# Altium footprint library Gate Driver Board.PcbLib: 117 footprints (part 7 of 8)
Each footprint in its own frame and in the unit in brackets; x right, y up, seen from the top. Pads: shape width x height; smd on the part's side, far side on the other; paste and mask are expansions set on the pad; w line width, h text height; cw(c..) or ccw(c..) is an arc to the next point about the centre after c.
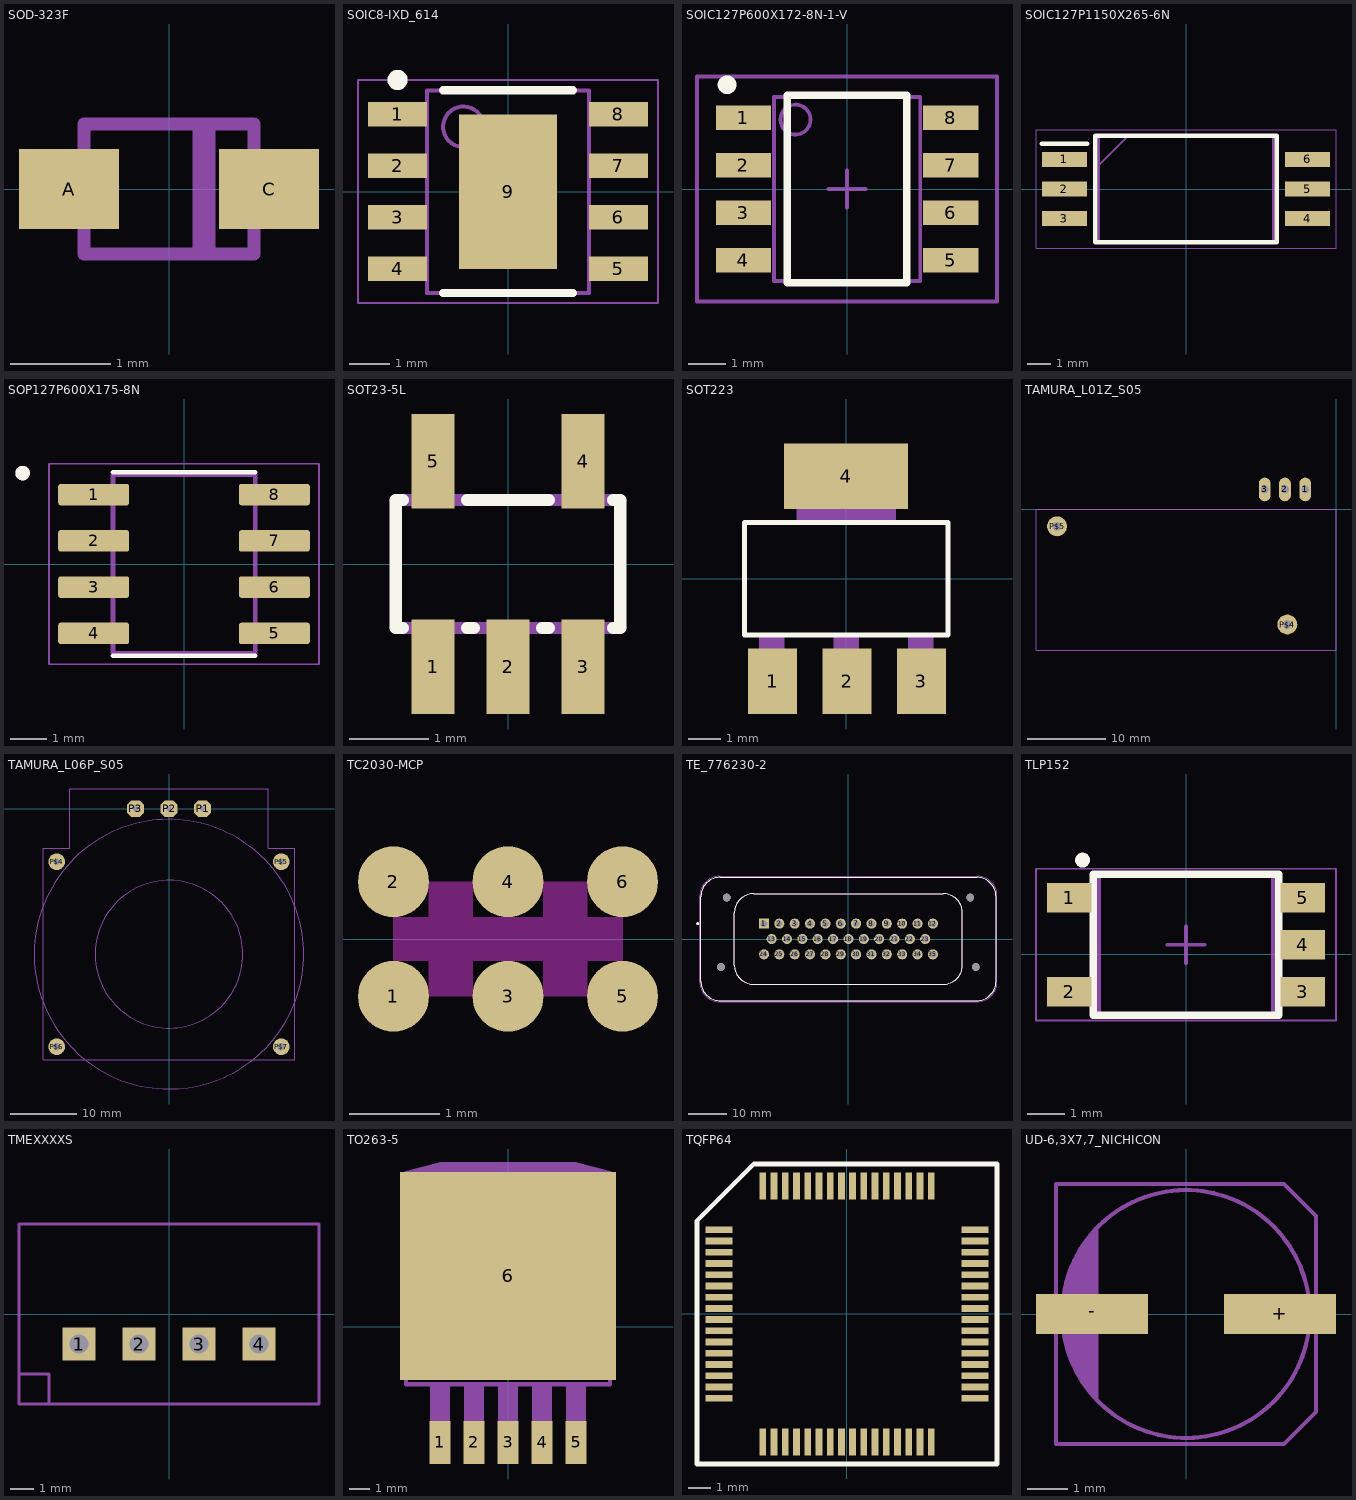
[diagram p6: the footprints below, top view; thin cyan lines are the x and y axes]

## SOD-323F [mm] "SOD-323F"
pads (2):
  rect 1x0.8 smd: A(-1,0) C(1,0)
Assembly Bottom:
  lines w0.127: -0.9,-0.2 -1.2,-0.2 -1.2,0.2 -0.9,0.2 ; 0.9,-0.2 1.2,-0.2 1.2,0.2 0.9,0.2
3D Body Bottom:
  lines w0.127: 0.3,0.6 0.3,-0.6 0.4,-0.6 0.4,0.6 ; -0.85,-0.65 -0.85,0.65 0.85,0.65 0.85,-0.65 -0.85,-0.65

## SOIC8-IXD_614 [mm]
height 1.7
pads (9):
  rect 1.45x0.6 smd: 1(-2.725,1.905) 2(-2.725,0.635) 3(-2.725,-0.635) 4(-2.725,-1.905) 5(2.725,-1.905) 6(2.725,-0.635) 7(2.725,0.635) 8(2.725,1.905)
  rect 2.41x3.81 smd: 9(0,0)
Top Overlay:
  circle w0.25: c-2.725,2.755 r0.125
  lines w0.2: -1.6,-2.5 1.6,-2.5 ; -1.6,2.5 1.6,2.5
Assembly Top:
  circle w0.1: c-1.1,1.6 r0.5
  lines w0.1: -2,-2.5 -2,2.5 2,2.5 2,-2.5 -2,-2.5
Courtyard Top:
  lines w0.05: -3.7,-2.75 -3.7,2.75 3.7,2.75 3.7,-2.75 -3.7,-2.75
  lines w0.1: -0.5,0 0.5,0 ; 0,-0.5 0,0.5
3D body "SOIC8-IXD_614.step": height 1.7, standoff 0, extent -3,-2.5 3,2.5

## SOIC127P600X172-8N-1-V [mm] "SOIC,1.27mm pitch;8 pin,3.90mm W X 4.90mm L X 1.72mm H body"
height 1.72
pads (8):
  rect 1.47x0.65 smd paste+0 mask+0: 1(-2.765,1.905) 2(-2.765,0.635) 3(-2.765,-0.635) 4(-2.765,-1.905) 5(2.765,-1.905) 6(2.765,-0.635) 7(2.765,0.635) 8(2.765,1.905)
Top Overlay:
  circle w0.25: c-3.2,2.78 r0.125
  lines w0.2: -1.6,-2.5 1.6,-2.5 1.6,2.5 -1.6,2.5 -1.6,-2.5
Assembly Bottom:
  text ".DESIGNATOR" at 0,0 h0.5
Mechanical 13:
  circle w0.1: c-1.372,1.852 r0.4
  lines w0.1: -1.95,-2.45 1.95,-2.45 1.95,2.45 -1.95,2.45 -1.95,-2.45
Mechanical 15:
  lines w0.1: -0.5,0 0.5,0 ; 0,-0.5 0,0.5 ; -4,-3 4,-3 4,3 -4,3 -4,-3
3D body "PG-DSO-8-69_Z8B00186941_V02_3D.STEP": height 1.73, standoff 0, extent -3,-2.45 3,2.45

## SOIC127P1150X265-6N [mm]
pads (6):
  rect 1.95x0.65 smd: 1(-5.225,1.27) 2(-5.225,0) 3(-5.225,-1.27) 4(5.225,-1.27) 5(5.225,0) 6(5.225,1.27)
Top Overlay:
  lines w0.2: -6.2,1.945 -4.25,1.945 ; -3.9,-2.29 3.9,-2.29 3.9,2.29 -3.9,2.29 -3.9,-2.29
Mechanical 13:
  lines w0.1: -3.75,1.02 -2.48,2.29 ; -3.75,-2.29 3.75,-2.29 3.75,2.29 -3.75,2.29 -3.75,-2.29
Mechanical 15:
  lines w0.05: -6.45,-2.54 6.45,-2.54 6.45,2.54 -6.45,2.54 -6.45,-2.54
3D body "Si8261ACD-C-IS.stp": height 2.65, standoff 0, extent -5.75,-2.29 5.75,2.29

## SOP127P600X175-8N [mm]
pads (8):
  rrect25% 1.95x0.59 smd: 1(-2.48,1.905) 2(-2.48,0.635) 3(-2.48,-0.635) 4(-2.48,-1.905) 5(2.48,-1.905) 6(2.48,-0.635) 7(2.48,0.635) 8(2.48,1.905)
Top Overlay:
  circle w0.2: c-4.43,2.495 r0.1
  lines w0.127: -1.95,-2.52 1.95,-2.52 ; -1.95,2.52 1.95,2.52
Mechanical 13:
  circle w0.2: c-4.43,2.495 r0.1
  lines w0.127: -1.95,-2.45 -1.95,2.45 1.95,2.45 1.95,-2.45 -1.95,-2.45
Mechanical 15:
  lines w0.05: -3.705,-2.75 -3.705,2.75 3.705,2.75 3.705,-2.75 -3.705,-2.75
3D body "step_temp.STEP": height 2.1, standoff 0, extent -3,-2.425 3,2.425

## SOT23-5L [mm] "SOT23-5L"
pads (5):
  rect 0.55x1.2 smd: 1(-0.95,-1.3) 2(0,-1.3) 3(0.95,-1.3) 4(0.95,1.3) 5(-0.95,1.3)
Top Overlay:
  lines w0.152: -1.328,-0.81 -1.422,-0.81 -1.422,0.81 -1.328,0.81 ; -0.522,-0.81 -0.428,-0.81 ; -0.522,0.81 0.522,0.81 ; 0.428,-0.81 0.522,-0.81 ; 1.328,-0.81 1.422,-0.81 1.422,0.81 1.328,0.81
Assembly Bottom:
  region: -1.2,-1.5 -1.2,-0.85 -0.7,-0.85 -0.7,-1.5
  region: -0.25,-1.5 -0.25,-0.85 0.25,-0.85 0.25,-1.5
  region: 0.7,-1.5 0.7,-0.85 1.2,-0.85 1.2,-1.5
  region: 0.7,0.85 0.7,1.5 1.2,1.5 1.2,0.85
  region: -1.2,0.85 -1.2,1.5 -0.7,1.5 -0.7,0.85
  lines w0.152: -1.422,-0.81 1.422,-0.81 ; -1.422,0.81 1.422,0.81
3D body "SOT23_5.stp": height 0.92, standoff 0.01, extent -1.5,-1.675 1.5,1.53

## SOT223 [mil] "SOT223"
pads (4):
  rect 59x79 smd: 1(-89,-124) 2(1,-124) 3(91,-124)
  rect 150x79 smd: 4(0,124)
Top Overlay:
  lines w6: -122.99,-68.07 -122.99,68.15 122.99,68.15 122.99,-68.07 -122.99,-68.07
Assembly Bottom:
  region: -60,70 -60,130 60,130 60,70
  region: -105,-130 -105,-70 -75,-70 -75,-130
  region: 75,-130 75,-70 105,-70 105,-130
  region: -15,-130 -15,-70 15,-70 15,-130
3D body "SOT223.STEP": height 63.49, standoff -3.42, extent -123.03,-142.69 132.87,133.86

## TAMURA_L01Z_S05 [mm] "TAMURA_L01Z_S05"
pads (5):
  oval 1.508x3.016 / inner round 0 / far side oval 1.508x3.016 hole 1: 1(-3.92,2.5) 2(-6.5,2.5) 3(-9.08,2.5)
  round 2.54 / inner round 0 / far side round 2.54 hole 1.1: P$4(-6.2,-14.7) P$5(-35.52,-2.2)
3D Body Bottom:
  lines w0.127: -38.2,-18 -38.2,0 0,0 0,-18 -38.2,-18
  text "L01Z    S05" at -29.21,-10.16 h3.94
3D body: height 1.27, standoff 0, extent -4.68,0.986 -3.159,4.015
3D body: height 1.27, standoff 0, extent -7.261,0.986 -5.74,4.015
3D body: height 1.27, standoff 0, extent -9.84,0.986 -8.319,4.015
3D body: height 1.27, standoff 0, extent -7.481,-15.981 -4.919,-13.419
3D body: height 1.27, standoff 0, extent -36.801,-3.481 -34.239,-0.919

## TAMURA_L06P_S05 [mm] "TAMURA_L06P_S05"
pads (7):
  oct 2.54x2.54 / inner round 0 / far side oct 2.54x2.54 hole 0.8: P1(5.08,0) P2(0,0) P3(-5.08,0)
  round 2.54 / inner round 0 / far side round 2.54 hole 1: P$4(-17,-8) P$5(17,-8)
  round 2.54 / inner round 0 / far side round 2.54 hole 1.1: P$6(-17,-36) P$7(17,-36)
3D Body Bottom:
  circle w0.127: c0,-22 r20.396
  circle w0.127: c0,-22 r11.18
  lines w0.127: -19,-38 -19,-6 -15,-6 -15,3 15,3 15,-6 19,-6 19,-38 -19,-38
3D body: height 1.27, standoff 0, extent 15.719,-37.281 18.281,-34.719
3D body: height 1.27, standoff 0, extent -18.281,-37.281 -15.719,-34.719
3D body: height 1.27, standoff 0, extent 15.719,-9.281 18.281,-6.719
3D body: height 1.27, standoff 0, extent -18.281,-9.281 -15.719,-6.719
3D body: height 1.27, standoff 0, extent 3.897,-1.183 6.263,1.183
3D body: height 1.27, standoff 0, extent -6.263,-1.183 -3.897,1.183
3D body: height 1.27, standoff 0, extent -1.183,-1.183 1.183,1.183

## TC2030-MCP [mil] "TC2030-MCP"
pads (6):
  rrect100% 31x31 smd paste+0: 1(50,-25) 2(50,25) 3(100,-25) 4(100,25) 5(150,-25) 6(150,25)
Top Layer keep-out:
  region: 50,-9.5 65.5,-9.5 65.5,-25 84.5,-25 84.5,-9.5 115.5,-9.5 115.5,-25 134.5,-25 134.5,-9.5 150,-9.5 150,9.5 134.5,9.5 134.5,25 115.5,25 115.5,9.5 84.5,9.5 84.5,25 65.5,25 65.5,9.5 50,9.5

## TE_776230-2 [mm]
pads (39):
  rect 2.625x2.625 hole 1.75: 1(-22,4)
  round 2.625 hole 1.75: 2(-18,4) 3(-14,4) 4(-10,4) 5(-6,4) 6(-2,4) 7(2,4) 8(6,4) 9(10,4) 10(14,4) 11(18,4) 12(22,4) 13(-20,0) 14(-16,0) 15(-12,0) 16(-8,0) 17(-4,0) 18(0,0) 19(4,0) 20(8,0) 21(12,0) 22(16,0) 23(20,0) 24(-22,-4) 25(-18,-4) 26(-14,-4) 27(-10,-4) 28(-6,-4) 29(-2,-4) 30(2,-4) 31(6,-4) 32(10,-4) 33(14,-4) 34(18,-4) 35(22,-4)
  round 2 hole 2 unplated: ""(-33.2,-7.3) ""(-31.7,10.8) ""(31.7,10.8) ""(33.2,-7.3)
Top Overlay:
  circle w0.4: c-39.25,4 r0.2
  lines w0.127: -38.45,-11.05 ccw(c-33.45,-11.05) -33.45,-16.05 33.45,-16.05 ccw(c33.45,-11.05) 38.45,-11.05 38.45,11.05 ccw(c33.45,11.05) 33.45,16.05 -33.45,16.05 ccw(c-33.45,11.05) -38.45,11.05 -38.45,-11.05 ; -29.7,-6.8 ccw(c-24.7,-6.8) -24.7,-11.8 24.7,-11.8 ccw(c24.7,-6.8) 29.7,-6.8 29.7,6.8 ccw(c24.7,6.8) 24.7,11.8 -24.7,11.8 ccw(c-24.7,6.8) -29.7,6.8 -29.7,-6.8
Mechanical 13:
  circle w0.4: c-22,4 r0.2
  lines w0.127: -38.45,-11.05 ccw(c-33.45,-11.05) -33.45,-16.05 33.45,-16.05 ccw(c33.45,-11.05) 38.45,-11.05 38.45,11.05 ccw(c33.45,11.05) 33.45,16.05 -33.45,16.05 ccw(c-33.45,11.05) -38.45,11.05 -38.45,-11.05 ; -29.7,-6.8 ccw(c-24.7,-6.8) -24.7,-11.8 24.7,-11.8 ccw(c24.7,-6.8) 29.7,-6.8 29.7,6.8 ccw(c24.7,6.8) 24.7,11.8 -24.7,11.8 ccw(c-24.7,6.8) -29.7,6.8 -29.7,-6.8
Mechanical 15:
  lines w0.05: -38.7,-11.3 ccw(c-33.7,-11.3) -33.7,-16.3 33.7,-16.3 ccw(c33.7,-11.3) 38.7,-11.3 38.7,11.3 ccw(c33.7,11.3) 33.7,16.3 -33.7,16.3 ccw(c-33.7,11.3) -38.7,11.3 -38.7,-11.3
3D body "776230-2--3DModel-STEP-1.STEP": height 30.48, standoff -7.49, extent -38.434,-15.964 38.466,16.136

## TLP152 [mm] "SOTFL, 5-Leads, Body 3.75x7.20mm, Pitch 1.27mm, IPC Medium Density"
height 2.2
pads (5):
  rect 1.2x0.8 smd: 1(-3.15,1.524) 2(-3.15,-1.016) 3(3.15,-1.016) 4(3.15,0.254) 5(3.15,1.524)
Top Overlay:
  lines w0.2: -2.5,-1.646 -2.5,2.154 2.5,2.154 2.5,-1.646 -2.5,-1.646
  lines w0.25: -2.72,2.538 cw(c-2.794,2.54) -2.72,2.547
Assembly Top:
  lines w0.1: -2.35,-1.646 2.35,-1.646 2.35,2.154 -2.35,2.154 -2.35,-1.646
Courtyard Top:
  lines w0.05: -4.05,-1.796 4.05,-1.796 4.05,2.304 -4.05,2.304 -4.05,-1.796
  lines w0.1: -0.5,0.254 0.5,0.254 ; 0,-0.246 0,0.754
3D body "User Library-TLP-152-1.STEP": height 2.11, standoff 0.01, extent -3.393,-1.651 3.383,2.149

## TMEXXXXS [mil] "TMEXXXXS"
pads (4):
  rect 55x55 / inner round 0 / far side rect 55x55 hole 32: 1(-150,-50) 2(-50,-50) 3(50,-50) 4(150,-50)
3D Body Bottom:
  lines w5: -250,-100 -200,-100 -200,-150 ; -250,-100 -250,150 250,150 250,-150 -200,-150 ; -250,-100 -250,-150 -200,-150
  text "A+" at 100,0 h77.5
  text "A-" at 0,0 h77.5
  text "E+" at -100,0 h77.5
  text "E-" at -200,0 h77.5
3D body: height 50, standoff 0, extent 124.1,-75.9 175.9,-24.1
3D body: height 50, standoff 0, extent 24.1,-75.9 75.9,-24.1
3D body: height 50, standoff 0, extent -75.9,-75.9 -24.1,-24.1
3D body: height 50, standoff 0, extent -175.9,-75.9 -124.1,-24.1

## TO263-5 [mil] "TO263-5"
pads (6):
  rect 42x85 smd: 1(-134,-228) 2(-67,-228) 3(0,-228) 4(67,-228) 5(134,-228)
  rect 425.2x409.84 smd: 6(0,100)
Assembly Bottom:
  region: -201,286.1 -201,302.29 -133,320.29 133,320.29 201,302.29 201,286.1
  region: 115,-260 115,-175 153,-175 153,-260
  region: 48,-260 48,-175 86,-175 86,-260
  region: -19,-260 -19,-175 19,-175 19,-260
  region: -86,-260 -86,-175 -48,-175 -48,-260
  region: -153,-260 -153,-175 -115,-175 -115,-260
  lines w8: -200.55,-113.39 -200.55,282.09 200.55,282.09 200.55,-113.39 ; -200.98,286.1 200.98,286.1 200.98,302.28 132.99,320.28 -132.99,320.28 -200.98,302.28 -200.98,286.1
3D Body Bottom:
  region: 115,-176 115,-110 153,-110 153,-176
  region: 48,-176 48,-110 86,-110 86,-176
  region: -19,-176 -19,-110 19,-110 19,-176
  region: -86,-176 -86,-110 -48,-110 -48,-176
  region: -153,-176 -153,-110 -115,-110 -115,-176
  lines w8: -200.55,-113.39 200.55,-113.39

## TQFP64 [mm] "TQFP64"
pads (64):
  rect 1.2x0.3 smd: 1(-5.7,3.75) 2(-5.7,3.25) 3(-5.7,2.75) 4(-5.7,2.25) 5(-5.7,1.75) 6(-5.7,1.25) 7(-5.7,0.75) 8(-5.7,0.25) 9(-5.7,-0.25) 10(-5.7,-0.75) 11(-5.7,-1.25) 12(-5.7,-1.75) 13(-5.7,-2.25) 14(-5.7,-2.75) 15(-5.7,-3.25) 16(-5.7,-3.75) 33(5.7,-3.75) 34(5.7,-3.25) 35(5.7,-2.75) 36(5.7,-2.25) 37(5.7,-1.75) 38(5.7,-1.25) 39(5.7,-0.75) 40(5.7,-0.25) 41(5.7,0.25) 42(5.7,0.75) 43(5.7,1.25) 44(5.7,1.75) 45(5.7,2.25) 46(5.7,2.75) 47(5.7,3.25) 48(5.7,3.75)
  rect 0.3x1.2 smd: 17(-3.75,-5.7) 18(-3.25,-5.7) 19(-2.75,-5.7) 20(-2.25,-5.7) 21(-1.75,-5.7) 22(-1.25,-5.7) 23(-0.75,-5.7) 24(-0.25,-5.7) 25(0.25,-5.7) 26(0.75,-5.7) 27(1.25,-5.7) 28(1.75,-5.7) 29(2.25,-5.7) 30(2.75,-5.7) 31(3.25,-5.7) 32(3.75,-5.7) 49(3.75,5.7) 50(3.25,5.7) 51(2.75,5.7) 52(2.25,5.7) 53(1.75,5.7) 54(1.25,5.7) 55(0.75,5.7) 56(0.25,5.7) 57(-0.25,5.7) 58(-0.75,5.7) 59(-1.25,5.7) 60(-1.75,5.7) 61(-2.25,5.7) 62(-2.75,5.7) 63(-3.25,5.7) 64(-3.75,5.7)
Top Overlay:
  lines w0.203: -6.675,-6.675 6.675,-6.675 6.675,6.675 -4.15,6.675 -6.675,4.15 -6.675,-6.675

## UD-6,3X7,7_NICHICON [mm] "UD-6,3X7,7_NICHICON"
pads (2):
  rect 2.8x1 smd: +(2.35,0) -(-2.35,0)
Assembly Bottom:
  circle w0.102: c0,0 r3.1
  region: -2.2,2.15 -2.339,2.008 -2.577,1.69 -2.773,1.345 -2.923,0.977 -3.024,0.593 -3.075,0.199 -3.075,-0.199 -3.024,-0.593 -2.923,-0.977 -2.773,-1.345 -2.577,-1.69 -2.339,-2.008 -2.2,-2.15
  lines w0.102: -3.25,-3.25 2.45,-3.25 3.25,-2.45 3.25,2.45 2.45,3.25 -3.25,3.25 -3.25,-3.25
3D Body Bottom:
  lines w0.102: -3.25,-0.7 -3.25,-3.25 2.45,-3.25 3.25,-2.45 ; -3.25,0.8 -3.25,3.25 2.45,3.25 3.25,2.45 ; -3,0.775 cw(c-0.002,0.005) 2.975,0.85 ; -2.975,-0.85 ccw(c0.002,-0.005) 3,-0.775